# Altium footprint library Zmod.PcbLib: 229 footprints (part 5 of 15)
Each footprint in its own frame and in the unit in brackets; x right, y up, seen from the top. Pads: shape width x height; smd on the part's side, far side on the other; paste and mask are expansions set on the pad; w line width, h text height; cw(c..) or ccw(c..) is an arc to the next point about the centre after c.
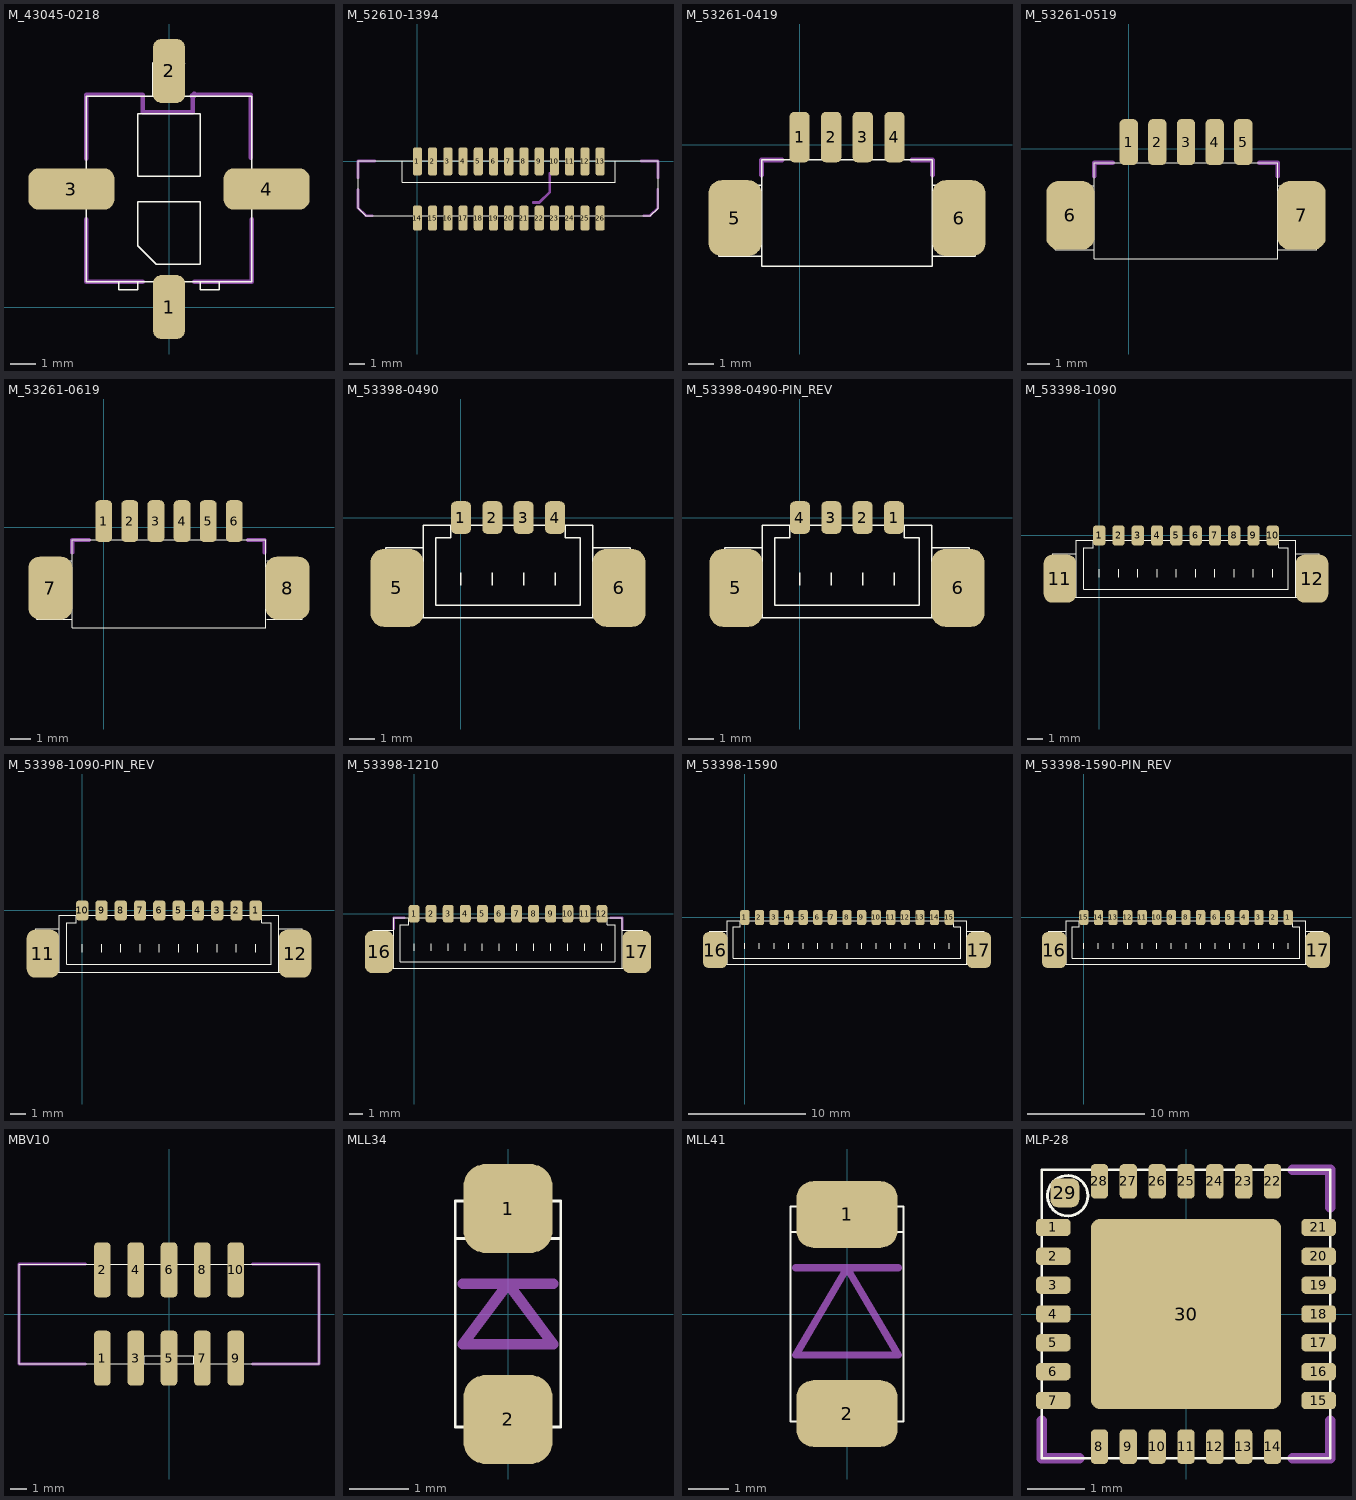
[diagram p4: the footprints below, top view; thin cyan lines are the x and y axes]

## M_43045-0218 [mm] "Molex 43045-0281 series 0 mm pitch, 2 way, plug, Rev. 1"
height 9.9
pads (4):
  rrect50% 1.27x2.54 smd paste+0: 1(0,0) 2(0,9.4)
  rrect50% 3.43x1.65 smd: 3(-3.885,4.7) 4(3.885,4.7)
Top Overlay:
  lines w0.05: -3.3,4.275 -4.975,4.275 -4.975,5.125 -3.3,5.125 ; -2,1 -2,0.7 -1.25,0.7 -1.25,1 ; -0.65,8.4 -0.65,9.7 -0.625,9.725 0.625,9.725 0.6,9.7 0.6,8.4 ; -0.45,0.975 -0.45,-0.7 0.4,-0.7 0.4,0.975 ; 1.25,1 1.25,0.7 2,0.7 2,1 ; 3.3,4.325 4.975,4.325 4.975,5.175 3.3,5.175 ; -3.3,1 -3.3,8.4 3.3,8.4 3.3,1 -3.3,1 ; -1.25,2.45 -1.25,4.2 1.25,4.2 1.25,1.7 -0.5,1.7 -1.25,2.45 ; -1.25,5.2 1.25,5.2 1.25,7.7 -1.25,7.7 -1.25,5.2
Mechanical 15:
  lines w0.18: -3.3,3.5 -3.3,1 -1.05,1 ; -3.3,5.9 -3.3,8.4 ; -3.3,8.45 -1.05,8.45 -1.05,7.75 0.95,7.75 0.95,8.4 ; 1,1 3.25,1 ; 1,8.45 3.25,8.45 3.25,5.95 ; 3.3,1 3.3,3.5
  lines w0.254: 0.95,8.4 1,8.45
  text ".Designator" at -1.75,4.2 h1.5

## M_52610-1394 [mm] "Molex 52610 series 1 mm pitch, 30 way, receptacle. Rev. 1"
height 7.25
pads (26):
  rrect50% 0.6x1.85 smd paste+0: 1(0,0) 2(1,0) 3(2,0) 4(3,0) 5(4,0) 6(5,-0.001) 7(6,0) 8(7,0) 9(8,0) 10(9,0) 11(10,0) 12(11,0) 13(12,-0.001)
  rrect50% 0.6x1.65 smd paste+0: 14(0,-3.725) 15(1,-3.725) 16(2,-3.725) 17(3,-3.725) 18(4,-3.725) 19(5,-3.725) 20(6,-3.725) 21(7,-3.725) 22(8,-3.725) 23(9,-3.725) 24(10,-3.725) 25(11,-3.725) 26(12,-3.725)
Top Overlay:
  lines w0.05: -1,0.037 -1,-1.363 13,-1.363 13,0.037 ; -3.9,-3.063 -3.9,-0.663 -3.9,0.037 15.8,0.037 15.8,-3.063 15.3,-3.562 -3.4,-3.562 -3.6,-3.363 -3.9,-3.063
Mechanical 15:
  lines w0.18: -3.9,-1.85 -3.9,-3.05 -3.387,-3.562 -2.987,-3.562 ; -3.9,-1.075 -3.9,0.025 -2.8,0.025 ; 7.6,-2.7 8,-2.7 8.7,-2 8.7,-0.8 ; 14.7,0.025 15.8,0.025 15.8,-1.075 ; 14.875,-3.562 15.275,-3.562 15.787,-3.05 15.787,-1.85
  text ".Designator" at 0.25,-2.575 h1.5

## M_53261-0419 [mm] "Molex 53261 series 1.25 mm pitch, 4 way, plug, Rev. 2"
height 3.4
pads (6):
  rrect50% 0.8x2 smd paste+0: 1(0,0.3) 2(1.25,0.3) 3(2.5,0.3) 4(3.75,0.3)
  rrect50% 2.1x3 smd: 5(-2.55,-2.9) 6(6.3,-2.9)
Top Overlay:
  lines w0.05: -1.5,-4.4 -3.2,-4.4 -3.2,-1.6 -1.5,-1.6 ; -0.2,-0.6 -0.2,0 0.2,0 0.2,-0.6 ; 1.05,-0.6 1.05,0 1.45,0 1.45,-0.6 ; 2.3,-0.6 2.3,0 2.7,0 2.7,-0.6 ; 3.55,-0.6 3.55,0 3.95,0 3.95,-0.6 ; 5.25,-4.4 6.95,-4.4 6.95,-1.6 5.25,-1.6 ; -1.5,-4.8 -1.5,-0.6 5.25,-0.6 5.25,-4.8 -1.5,-4.8
Mechanical 15:
  lines w0.2: -1.5,-1.2 -1.5,-0.6 -0.7,-0.6 ; 4.45,-0.6 5.25,-0.6 5.25,-1.2
  text ".Designator" at -1.25,-3.75 h1.5

## M_53261-0519 [mm] "Molex 53261 series 1.25 mm pitch, 5 way, plug, Rev. 2"
height 3.4
pads (7):
  rrect50% 0.8x2 smd paste+0: 1(0,0.3) 2(1.25,0.3) 3(2.5,0.3) 4(3.75,0.3) 5(5,0.3)
  rrect50% 2.1x3 smd: 6(-2.55,-2.9) 7(7.55,-2.9)
Top Overlay:
  lines w0.05: -1.5,-4.4 -3.2,-4.4 -3.2,-1.6 -1.5,-1.6 ; -0.2,-0.6 -0.2,0 0.2,0 0.2,-0.6 ; 1.05,-0.6 1.05,0 1.45,0 1.45,-0.6 ; 2.3,-0.6 2.3,0 2.7,0 2.7,-0.6 ; 3.55,-0.6 3.55,0 3.95,0 3.95,-0.6 ; 4.8,-0.6 4.8,0 5.2,0 5.2,-0.6 ; 6.5,-4.4 8.2,-4.4 8.2,-1.6 6.5,-1.6 ; -1.5,-4.8 6.5,-4.8 6.5,-0.6 -1.5,-0.6 -1.5,-4.8
Mechanical 15:
  lines w0.2: -1.5,-1.2 -1.5,-0.6 -0.7,-0.6 ; 5.7,-0.6 6.5,-0.6 6.5,-1.2
  text ".Designator" at -1.25,-3.75 h1.5

## M_53261-0619 [mm] "Molex 53261 series 1.25 mm pitch, 6 way, plug, Rev. 2"
height 3.4
pads (8):
  rrect50% 0.8x2 smd paste+0: 1(0,0.3) 2(1.25,0.3) 3(2.5,0.3) 4(3.75,0.3) 5(5,0.3) 6(6.25,0.3)
  rrect50% 2.1x3 smd: 7(-2.55,-2.9) 8(8.8,-2.9)
Top Overlay:
  lines w0.05: -1.5,-4.4 -3.2,-4.4 -3.2,-1.6 -1.5,-1.6 ; -0.2,-0.6 -0.2,0 0.2,0 0.2,-0.6 ; 1.05,-0.6 1.05,0 1.45,0 1.45,-0.6 ; 2.3,-0.6 2.3,0 2.7,0 2.7,-0.6 ; 3.55,-0.6 3.55,0 3.95,0 3.95,-0.6 ; 4.8,-0.6 4.8,0 5.2,0 5.2,-0.6 ; 6.05,-0.6 6.05,0 6.45,0 6.45,-0.6 ; 7.8,-4.4 9.5,-4.4 9.5,-1.6 7.8,-1.6 ; -1.5,-4.8 7.75,-4.8 7.75,-0.6 -1.5,-0.6 -1.5,-4.8
Mechanical 15:
  lines w0.2: -1.5,-1.2 -1.5,-0.6 -0.7,-0.6 ; 6.9,-0.6 7.7,-0.6 7.7,-1.2
  text ".Designator" at -1.25,-3.75 h1.5

## M_53398-0490 [mm] "Molex 53398-04XX Rev.1"
height 4.7
pads (6):
  rrect50% 0.8x1.3 smd: 1(0,0) 2(1.25,0) 3(2.5,0) 4(3.75,0)
  rrect50% 2.1x3.1 smd: 5(-2.55,-2.8) 6(6.3,-2.8)
Top Overlay:
  lines w0.05: -1.5,-1.2 -3,-1.2 -3,-4 -1.5,-4 ; -0.4,-0.3 -0.4,-0.8 -1,-0.8 -1,-3.5 4.75,-3.5 4.75,-0.8 4.15,-0.8 4.15,-0.3 ; 0,-2.7 0,-2.2 ; 0,-0.3 0,0.3 ; 1.25,-2.7 1.25,-2.2 ; 1.25,-0.3 1.25,0.3 ; 2.5,-2.7 2.5,-2.2 ; 2.5,-0.3 2.5,0.3 ; 3.75,-2.7 3.75,-2.2 ; 3.75,-0.3 3.75,0.3 ; 5.25,-1.2 6.75,-1.2 6.75,-4 5.25,-4 ; -1.5,-4 -1.5,-0.3 5.25,-0.3 5.25,-4 ; -1.5,-4 5.25,-4

## M_53398-0490-PIN_REV [mm] "Molex 53398-04XX Rev.1"
height 4.7
pads (6):
  rrect50% 0.8x1.3 smd: 1(3.75,0) 2(2.5,0) 3(1.25,0) 4(0,0)
  rrect50% 2.1x3.1 smd: 5(-2.55,-2.8) 6(6.3,-2.8)
Top Overlay:
  lines w0.05: -1.5,-1.2 -3,-1.2 -3,-4 -1.5,-4 ; -0.4,-0.3 -0.4,-0.8 -1,-0.8 -1,-3.5 4.75,-3.5 4.75,-0.8 4.15,-0.8 4.15,-0.3 ; 0,-2.7 0,-2.2 ; 0,-0.3 0,0.3 ; 1.25,-2.7 1.25,-2.2 ; 1.25,-0.3 1.25,0.3 ; 2.5,-2.7 2.5,-2.2 ; 2.5,-0.3 2.5,0.3 ; 3.75,-2.7 3.75,-2.2 ; 3.75,-0.3 3.75,0.3 ; 5.25,-1.2 6.75,-1.2 6.75,-4 5.25,-4 ; -1.5,-4 -1.5,-0.3 5.25,-0.3 5.25,-4 ; -1.5,-4 5.25,-4

## M_53398-1090 [mm] "Molex 53398-10XX Rev.1"
height 4.7
pads (12):
  rrect50% 0.8x1.3 smd: 1(0,0) 2(1.25,0) 3(2.5,0) 4(3.75,0) 5(5,0) 6(6.25,0) 7(7.5,0) 8(8.75,0) 9(10,0) 10(11.25,0)
  rrect50% 2.1x3.1 smd: 11(-2.55,-2.8) 12(13.8,-2.8)
Top Overlay:
  lines w0.05: -1.5,-1.2 -3,-1.2 -3,-4 -1.5,-4 ; -0.4,-0.3 -0.4,-0.8 -1,-0.8 -1,-3.5 12.25,-3.5 12.25,-0.8 11.65,-0.8 11.65,-0.3 ; 0,-2.7 0,-2.2 ; 0,-0.3 0,0.3 ; 1.25,-2.7 1.25,-2.2 ; 1.25,-0.3 1.25,0.3 ; 2.5,-2.7 2.5,-2.2 ; 2.5,-0.3 2.5,0.3 ; 3.75,-2.7 3.75,-2.2 ; 3.75,-0.3 3.75,0.3 ; 5,-2.7 5,-2.2 ; 5,-0.3 5,0.3 ; 6.25,-2.7 6.25,-2.2 ; 6.25,-0.3 6.25,0.3 ; 7.5,-2.7 7.5,-2.2 ; 7.5,-0.3 7.5,0.3 ; 8.75,-2.7 8.75,-2.2 ; 8.75,-0.3 8.75,0.3 ; 10,-2.7 10,-2.2 ; 10,-0.3 10,0.3 ; 11.25,-2.7 11.25,-2.2 ; 11.25,-0.3 11.25,0.3 ; 12.75,-1.2 14.25,-1.2 14.25,-4 12.75,-4 ; -1.5,-4 12.75,-4 ; -1.5,-4 -1.5,-0.3 12.75,-0.3 12.75,-4
Mechanical 15:
  text ".Designator" at 0,-2.4 h1.5

## M_53398-1090-PIN_REV [mm] "Molex 53398-10XX Rev.1"
height 4.7
pads (12):
  rrect50% 0.8x1.3 smd: 1(11.25,0) 2(10,0) 3(8.75,0) 4(7.5,0) 5(6.25,0) 6(5,0) 7(3.75,0) 8(2.5,0) 9(1.25,0) 10(0,0)
  rrect50% 2.1x3.1 smd: 11(-2.55,-2.8) 12(13.8,-2.8)
Top Overlay:
  lines w0.05: -1.5,-1.2 -3,-1.2 -3,-4 -1.5,-4 ; -0.4,-0.3 -0.4,-0.8 -1,-0.8 -1,-3.5 12.25,-3.5 12.25,-0.8 11.65,-0.8 11.65,-0.3 ; 0,-2.7 0,-2.2 ; 0,-0.3 0,0.3 ; 1.25,-2.7 1.25,-2.2 ; 1.25,-0.3 1.25,0.3 ; 2.5,-2.7 2.5,-2.2 ; 2.5,-0.3 2.5,0.3 ; 3.75,-2.7 3.75,-2.2 ; 3.75,-0.3 3.75,0.3 ; 5,-2.7 5,-2.2 ; 5,-0.3 5,0.3 ; 6.25,-2.7 6.25,-2.2 ; 6.25,-0.3 6.25,0.3 ; 7.5,-2.7 7.5,-2.2 ; 7.5,-0.3 7.5,0.3 ; 8.75,-2.7 8.75,-2.2 ; 8.75,-0.3 8.75,0.3 ; 10,-2.7 10,-2.2 ; 10,-0.3 10,0.3 ; 11.25,-2.7 11.25,-2.2 ; 11.25,-0.3 11.25,0.3 ; 12.75,-1.2 14.25,-1.2 14.25,-4 12.75,-4 ; -1.5,-4 -1.5,-0.3 12.75,-0.3 12.75,-4 ; -1.5,-4 12.75,-4
Mechanical 15:
  text ".Designator" at 0,-2.4 h1.5

## M_53398-1210 [mm] "Molex 53398-1210 Rev.1"
height 4.7
pads (14):
  rrect50% 0.8x1.3 smd: 1(0,0) 2(1.25,0) 3(2.5,0) 4(3.75,0) 5(5,0) 6(6.25,0) 7(7.5,0) 8(8.75,0) 9(10,0) 10(11.25,0) 11(12.5,0) 12(13.75,0)
  rrect50% 2.1x3.1 smd: 16(-2.55,-2.8) 17(16.3,-2.8)
Top Overlay:
  lines w0.05: -1.5,-1.2 -3,-1.2 -3,-4 -1.5,-4 ; -0.4,-0.3 -0.4,-0.8 -1,-0.8 -1,-3.5 14.7,-3.5 ; 0,-2.7 0,-2.2 ; 0,-0.3 0,0.3 ; 1.25,-2.7 1.25,-2.2 ; 1.25,-0.3 1.25,0.3 ; 2.5,-2.7 2.5,-2.2 ; 2.5,-0.3 2.5,0.3 ; 3.75,-2.7 3.75,-2.2 ; 3.75,-0.3 3.75,0.3 ; 5,-2.7 5,-2.2 ; 5,-0.3 5,0.3 ; 6.25,-2.7 6.25,-2.2 ; 6.25,-0.3 6.25,0.3 ; 7.5,-2.7 7.5,-2.2 ; 7.5,-0.3 7.5,0.3 ; 8.75,-2.7 8.75,-2.2 ; 8.75,-0.3 8.75,0.3 ; 10,-2.7 10,-2.2 ; 10,-0.3 10,0.3 ; 11.25,-2.7 11.25,-2.2 ; 11.25,-0.3 11.25,0.3 ; 12.5,-2.7 12.5,-2.2 ; 12.5,-0.3 12.5,0.3 ; 13.75,-2.7 13.75,-2.2 ; 13.75,-0.3 13.75,0.3 ; 14.125,-0.3 14.125,-0.8 14.725,-0.8 14.725,-3.5 ; 15.2,-0.3 -1.5,-0.3 -1.5,-4 ; 15.225,-4 15.225,-0.3 ; 15.225,-1.2 16.725,-1.2 16.725,-4 ; 16.7,-4 -1.5,-4
Mechanical 15:
  lines w0.18: -1.5,-1.1 -1.5,-0.3 -0.7,-0.3 ; 14.4,-0.3 15.225,-0.3 15.225,-1.15
  text ".Designator" at -0.425,-2.7 h1.52

## M_53398-1590 [mm] "Molex 53398-15XX Rev.1"
height 4.7
pads (17):
  rrect50% 0.8x1.3 smd: 1(0,0) 2(1.25,0) 3(2.5,0) 4(3.75,0) 5(5,0) 6(6.25,0) 7(7.5,0) 8(8.75,0) 9(10,0) 10(11.25,0) 11(12.5,0) 12(13.75,0) 13(15,0) 14(16.25,0) 15(17.5,0)
  rrect50% 2.1x3.1 smd: 16(-2.55,-2.8) 17(20.05,-2.8)
Top Overlay:
  lines w0.05: -1.5,-1.2 -3,-1.2 -3,-4 -1.5,-4 ; -0.4,-0.3 -0.4,-0.8 -1,-0.8 -1,-3.5 18.5,-3.5 18.5,-0.8 17.9,-0.8 17.9,-0.3 ; 0,-2.7 0,-2.2 ; 0,-0.3 0,0.3 ; 1.25,-2.7 1.25,-2.2 ; 1.25,-0.3 1.25,0.3 ; 2.5,-2.7 2.5,-2.2 ; 2.5,-0.3 2.5,0.3 ; 3.75,-2.7 3.75,-2.2 ; 3.75,-0.3 3.75,0.3 ; 5,-2.7 5,-2.2 ; 5,-0.3 5,0.3 ; 6.25,-2.7 6.25,-2.2 ; 6.25,-0.3 6.25,0.3 ; 7.5,-2.7 7.5,-2.2 ; 7.5,-0.3 7.5,0.3 ; 8.75,-2.7 8.75,-2.2 ; 8.75,-0.3 8.75,0.3 ; 10,-2.7 10,-2.2 ; 10,-0.3 10,0.3 ; 11.25,-2.7 11.25,-2.2 ; 11.25,-0.3 11.25,0.3 ; 12.5,-2.7 12.5,-2.2 ; 12.5,-0.3 12.5,0.3 ; 13.75,-2.7 13.75,-2.2 ; 13.75,-0.3 13.75,0.3 ; 15,-2.7 15,-2.2 ; 15,-0.3 15,0.3 ; 16.25,-2.7 16.25,-2.2 ; 16.25,-0.3 16.25,0.3 ; 17.5,-2.7 17.5,-2.2 ; 17.5,-0.3 17.5,0.3 ; 19,-1.2 20.5,-1.2 20.5,-4 19,-4 ; -1.5,-4 19,-4 ; -1.5,-4 -1.5,-0.3 19,-0.3 19,-4

## M_53398-1590-PIN_REV [mm] "Molex 53398-15XX Rev.1"
height 4.7
pads (17):
  rrect50% 0.8x1.3 smd: 1(17.5,0) 2(16.25,0) 3(15,0) 4(13.75,0) 5(12.5,0) 6(11.25,0) 7(10,0) 8(8.75,0) 9(7.5,0) 10(6.25,0) 11(5,0) 12(3.75,0) 13(2.5,0) 14(1.25,0) 15(0,0)
  rrect50% 2.1x3.1 smd: 16(-2.55,-2.8) 17(20.05,-2.8)
Top Overlay:
  lines w0.05: -1.5,-1.2 -3,-1.2 -3,-4 -1.5,-4 ; -0.4,-0.3 -0.4,-0.8 -1,-0.8 -1,-3.5 18.5,-3.5 18.5,-0.8 17.9,-0.8 17.9,-0.3 ; 0,-2.7 0,-2.2 ; 0,-0.3 0,0.3 ; 1.25,-2.7 1.25,-2.2 ; 1.25,-0.3 1.25,0.3 ; 2.5,-2.7 2.5,-2.2 ; 2.5,-0.3 2.5,0.3 ; 3.75,-2.7 3.75,-2.2 ; 3.75,-0.3 3.75,0.3 ; 5,-2.7 5,-2.2 ; 5,-0.3 5,0.3 ; 6.25,-2.7 6.25,-2.2 ; 6.25,-0.3 6.25,0.3 ; 7.5,-2.7 7.5,-2.2 ; 7.5,-0.3 7.5,0.3 ; 8.75,-2.7 8.75,-2.2 ; 8.75,-0.3 8.75,0.3 ; 10,-2.7 10,-2.2 ; 10,-0.3 10,0.3 ; 11.25,-2.7 11.25,-2.2 ; 11.25,-0.3 11.25,0.3 ; 12.5,-2.7 12.5,-2.2 ; 12.5,-0.3 12.5,0.3 ; 13.75,-2.7 13.75,-2.2 ; 13.75,-0.3 13.75,0.3 ; 15,-2.7 15,-2.2 ; 15,-0.3 15,0.3 ; 16.25,-2.7 16.25,-2.2 ; 16.25,-0.3 16.25,0.3 ; 17.5,-2.7 17.5,-2.2 ; 17.5,-0.3 17.5,0.3 ; 19,-1.2 20.5,-1.2 20.5,-4 19,-4 ; -1.5,-4 -1.5,-0.3 19,-0.3 19,-4 ; -1.5,-4 19,-4

## MBV10 [mm] "Auk MBV series 2 mm pitch, 10 way, plug. Rev. 1"
height 5.5
pads (10):
  rrect50% 1x3.3 smd: 1(-4,-2.65) 2(-4,2.65) 3(-2,-2.65) 4(-2,2.65) 5(0,-2.65) 6(0,2.65) 7(2,-2.65) 8(2,2.65) 9(4,-2.65) 10(4,2.65)
Top Overlay:
  lines w0.05: -1.5,-3 -1.5,-2.5 1.5,-2.5 1.5,-3 ; -9,-3 -9,0 -9,3 9,3 9,-3 -9,-3
Mechanical 15:
  lines w0.18: -5,-3 -9,-3 -9,3 -5,3 ; 5,-3 9,-3 9,3 5,3
  text "1" at -5.5,-2.5 h1
  text ".Designator" at -7.5,-0.5 h1.5

## MLL34 [mm] "MIMIMELF"
height 1.8
pads (2):
  rrect50% 1.5x1.5 smd: 1(0,1.778) 2(0,-1.778)
Top Overlay:
  lines w0.05: -0.889,1.27 0.889,1.27 ; -0.889,-1.905 0.889,-1.905 0.889,1.905 -0.889,1.905 -0.889,-1.905
Mechanical 15:
  lines w0.18: -0.762,0.508 0.762,0.508 ; -0.762,-0.508 0.762,-0.508 0,0.508 -0.762,-0.508
  text ".Designator" at 0.127,-1.905 h1.5

## MLL41 [mm] "MIMIMELF"
height 2.5
pads (2):
  rrect50% 2.5x1.65 smd: 1(0,2.464) 2(0,-2.464)
Top Overlay:
  lines w0.05: -1.397,2.032 1.397,2.032 ; -1.397,-2.667 1.397,-2.667 1.397,2.667 -1.397,2.667 -1.397,-2.667
Mechanical 15:
  lines w0.18: -1.27,1.143 1.27,1.143 ; -1.27,-1.016 0,1.143 1.27,-1.016 -1.27,-1.016
  text ".Designator" at -0.127,-2.413 h1.5

## MLP-28 [mm]
height 1.016
pads (30):
  rrect50% 0.6x0.3 smd paste+0: 1(-2.3,1.5) 2(-2.3,1) 3(-2.3,0.5) 4(-2.3,0) 5(-2.3,-0.5) 6(-2.3,-1) 7(-2.3,-1.5) 15(2.3,-1.5) 16(2.3,-1) 17(2.3,-0.5) 18(2.3,0) 19(2.3,0.5) 20(2.3,1) 21(2.3,1.5)
  rrect50% 0.3x0.6 smd paste+0: 8(-1.5,-2.3) 9(-1,-2.3) 10(-0.5,-2.3) 11(0,-2.3) 12(0.5,-2.3) 13(1,-2.3) 14(1.5,-2.3) 22(1.5,2.3) 23(1,2.3) 24(0.5,2.3) 25(0,2.3) 26(-0.5,2.3) 27(-1,2.3) 28(-1.5,2.3)
  rrect50% 0.5x0.5 smd paste+0: 29(-2.1,2.1)
  rrect10% 3.3x3.3 smd paste+0: 30(0,0)
Top Overlay:
  circle w0.05: c-2.05,2.05 r0.35
  lines w0.05: -2.5,-2.5 2.5,-2.5 2.5,2.5 -2.5,2.5 -2.5,-2.5
Mechanical 15:
  lines w0.18: -2.5,-1.85 -2.5,-2.5 -1.85,-2.5 ; 1.85,-2.5 2.5,-2.5 2.5,-1.85 ; 1.85,2.5 2.5,2.5 2.5,1.85
  text ".Designator" at -2.032,1.016 h1.5